# Altium footprint library North POLE.PcbLib: 419 footprints (part 9 of 27)
Each footprint in its own frame and in the unit in brackets; x right, y up, seen from the top. Pads: shape width x height; smd on the part's side, far side on the other; paste and mask are expansions set on the pad; w line width, h text height; cw(c..) or ccw(c..) is an arc to the next point about the centre after c.
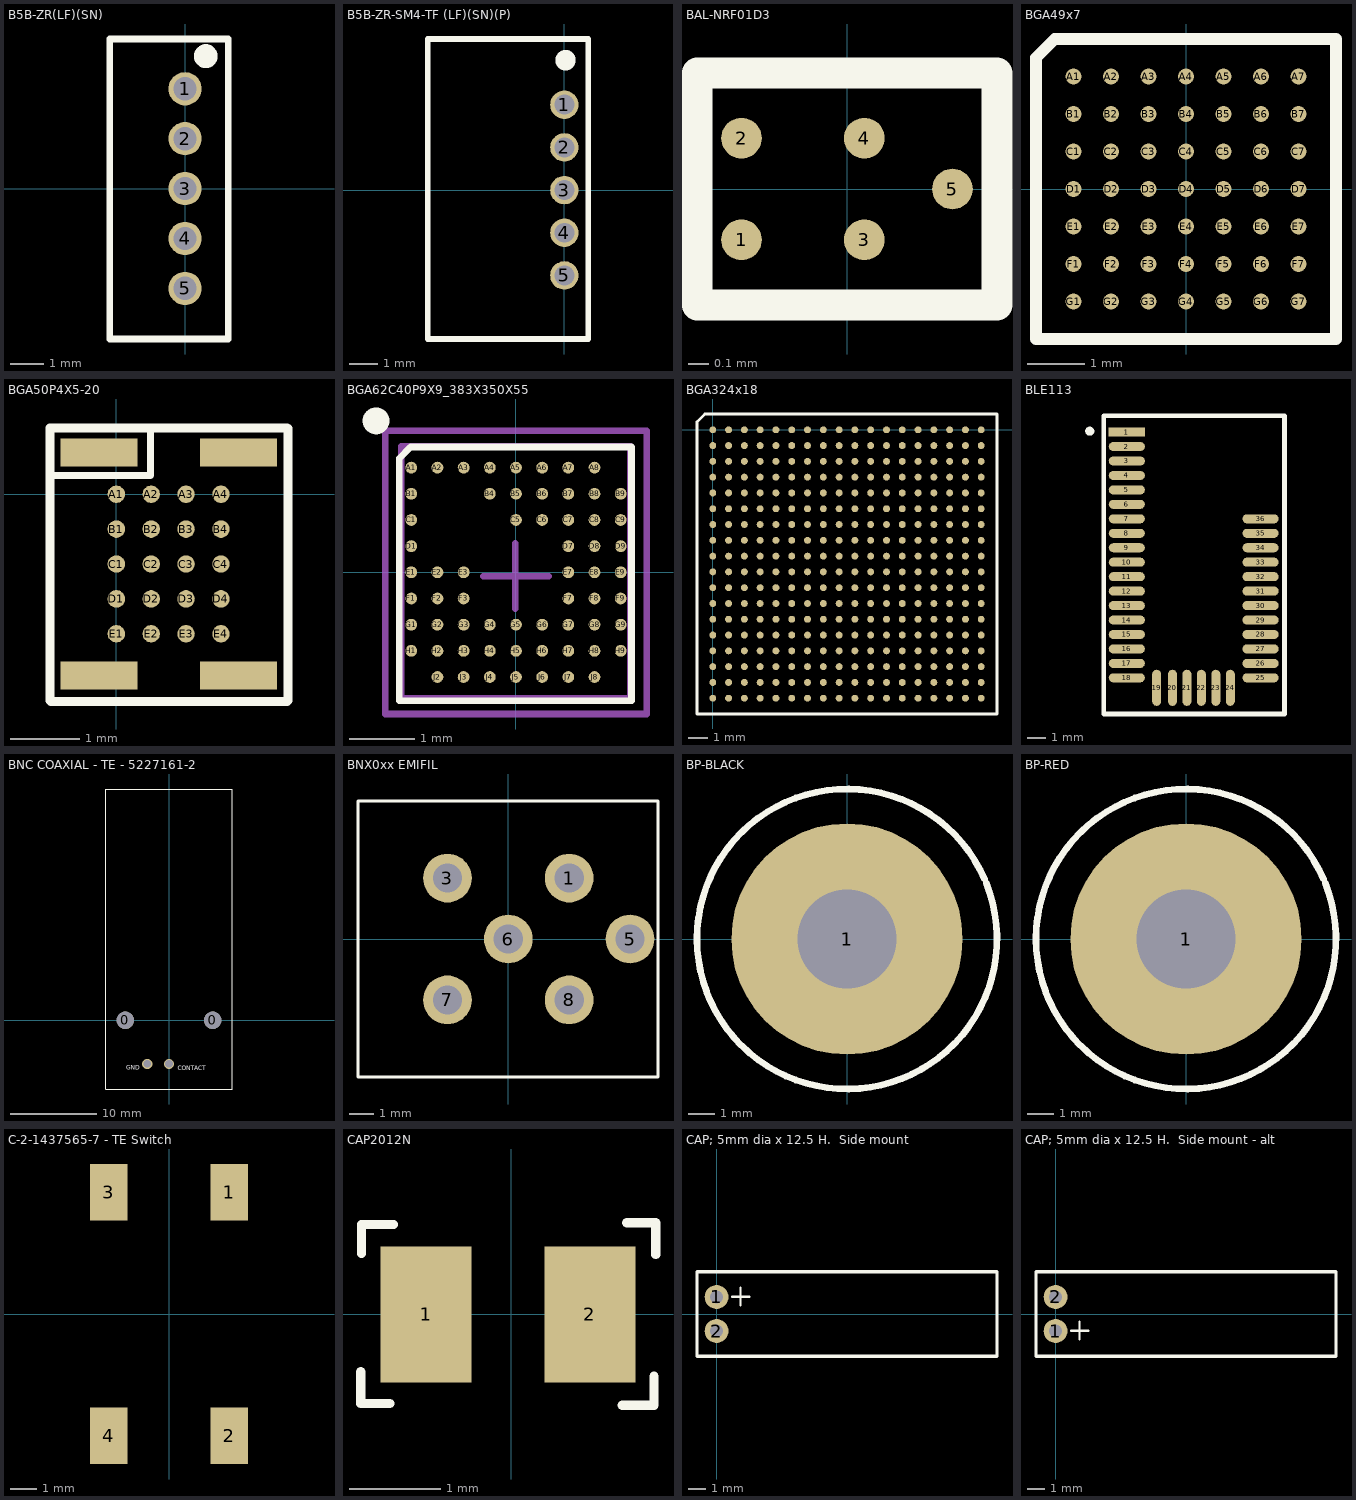
[diagram p8: the footprints below, top view; thin cyan lines are the x and y axes]

## B5B-ZR(LF)(SN) [mm] "0.156-inch-separation 1x2 header with shroud"
pads (5):
  round 1 hole 0.7: 1(0,3) 2(0,1.5) 3(0,0) 4(0,-1.5) 5(0,-3)
Top Overlay:
  lines w0.203: -2.261,-4.521 -2.261,4.496 1.295,4.496 1.295,-4.521 -2.261,-4.521
  lines w0.508: 0.68,4.069 ccw(c0.624,3.981) 0.711,4.039
3D body: height 4.5, standoff -2.7, extent -2.21,-4.5 1.29,4.5

## B5B-ZR-SM4-TF (LF)(SN)(P) [mm] "0.156-inch-separation 1x2 header with shroud"
pads (5):
  round 1 hole 0.7: 1(0,3) 2(0,1.5) 3(0,0) 4(0,-1.5) 5(0,-3)
Top Overlay:
  lines w0.203: -4.801,-5.232 0.838,-5.232 0.838,5.309 -4.801,5.309 -4.801,-5.232
  lines w0.508: 0.095,4.654 ccw(c0.04,4.565) 0.127,4.623
3D body: height 3.75, standoff -1.45, extent -4.797,-5.275 0.203,5.225

## BAL-NRF01D3 [mm] "ST BAL-NRF01D3"
pads (5):
  round 0.2 smd: 1(-0.519,-0.25) 2(-0.519,0.25) 3(0.085,-0.25) 4(0.085,0.25) 5(0.518,0)
Top Overlay:
  lines w0.152: -0.737,-0.57 0.737,-0.57 0.737,0.57 -0.737,0.57 -0.737,-0.57
3D body: height 0.63, standoff 0, extent -0.737,-0.57 0.737,0.57

## BGA49x7 [mm]
pads (49):
  round 0.275 smd mask+0.05: A1(-1.95,1.95) A2(-1.3,1.95) A3(-0.65,1.95) A4(0,1.95) A5(0.65,1.95) A6(1.3,1.95) A7(1.95,1.95) B1(-1.95,1.3) B2(-1.3,1.3) B3(-0.65,1.3) B4(0,1.3) B5(0.65,1.3) B6(1.3,1.3) B7(1.95,1.3) C1(-1.95,0.65) C2(-1.3,0.65) C3(-0.65,0.65) C4(0,0.65) C5(0.65,0.65) C6(1.3,0.65) C7(1.95,0.65) D1(-1.95,0) D2(-1.3,0) D3(-0.65,0) D4(0,0) D5(0.65,0) D6(1.3,0) D7(1.95,0) E1(-1.95,-0.65) E2(-1.3,-0.65) E3(-0.65,-0.65) E4(0,-0.65) E5(0.65,-0.65) E6(1.3,-0.65) E7(1.95,-0.65) F1(-1.95,-1.3) F2(-1.3,-1.3) F3(-0.65,-1.3) F4(0,-1.3) F5(0.65,-1.3) F6(1.3,-1.3) F7(1.95,-1.3) G1(-1.95,-1.95) G2(-1.3,-1.95) G3(-0.65,-1.95) G4(0,-1.95) G5(0.65,-1.95) G6(1.3,-1.95) G7(1.95,-1.95)
Top Overlay:
  lines w0.2: -2.6,-2.6 2.6,-2.6 2.6,2.6 -2.275,2.6 -2.6,2.275 -2.6,-2.6
3D body: height 0.65, standoff 0.2, extent -2.52,-2.5 2.5,2.5

## BGA50P4X5-20 [mm] "4x5 BGA for OVM campea"
pads (24):
  round 0.25 smd mask+0.075: A1(0,0) A2(0.5,0) A3(1,0) A4(1.5,0) B1(0,-0.5) B2(0.5,-0.5) B3(1,-0.5) B4(1.5,-0.5) C1(0,-1) C2(0.5,-1) C3(1,-1) C4(1.5,-1) D2(0.5,-1.5) D3(1,-1.5) D4(1.5,-1.5) E1(0,-2) E2(0.5,-2) E3(1,-2) E4(1.5,-2)
  oval 0.25x0.254 smd mask+0.075: D1(0,-1.5)
  rect 1.1x0.4 smd: ""(-0.25,-2.6) ""(-0.25,0.6) ""(1.75,-2.6) ""(1.75,0.6)
Top Overlay:
  lines w0.1: -0.91,0.27 0.49,0.27 0.49,0.94
  lines w0.127: -0.95,-2.96 -0.95,0.95 2.45,0.95 2.46,0.94 2.46,-2.96 2.45,-2.97 -0.94,-2.97 -0.95,-2.96

## BGA62C40P9X9_383X350X55 [mm] "BGA, 62-Leads, Body 3,8x3,5mm,  Pitch 0,40mm"
height 0.55
pads (62):
  round 0.18 smd mask+0.102: A1(-1.6,1.6)
  round 0.18 smd: A2(-1.2,1.6) A3(-0.8,1.6) A4(-0.4,1.6) A5(0,1.6) A6(0.4,1.6) A7(0.8,1.6) A8(1.2,1.6) B1(-1.6,1.2) B4(-0.4,1.2) B5(0,1.2) B6(0.4,1.2) B7(0.8,1.2) B8(1.2,1.2) B9(1.6,1.2) C1(-1.6,0.8) C5(0,0.8) C6(0.4,0.8) C7(0.8,0.8) C8(1.2,0.8) C9(1.6,0.8) D1(-1.6,0.4) D7(0.8,0.4) D8(1.2,0.4) D9(1.6,0.4) E1(-1.6,0) E2(-1.2,0) E3(-0.8,0) E7(0.8,0) E8(1.2,0) E9(1.6,0) F1(-1.6,-0.4) F2(-1.2,-0.4) F3(-0.8,-0.4) F7(0.8,-0.4) F8(1.2,-0.4) F9(1.6,-0.4) G1(-1.6,-0.8) G2(-1.2,-0.8) G3(-0.8,-0.8) G4(-0.4,-0.8) G5(0,-0.8) G6(0.4,-0.8) G7(0.8,-0.8) G8(1.2,-0.8) G9(1.6,-0.8) H1(-1.6,-1.2) H2(-1.2,-1.2) H3(-0.8,-1.2) H4(-0.4,-1.2) H5(0,-1.2) H6(0.4,-1.2) H7(0.8,-1.2) H8(1.2,-1.2) H9(1.6,-1.2) J2(-1.2,-1.6) J3(-0.8,-1.6) J4(-0.4,-1.6) J5(0,-1.6) J6(0.4,-1.6) J7(0.8,-1.6) J8(1.2,-1.6)
Top Overlay:
  circle w0.2: c-2.139,2.314 r0.105
  lines w0.1: -1.785,-1.965 -1.785,1.74 -1.61,1.915 1.765,1.915 1.765,-1.965 -1.785,-1.965
Mechanical 13:
  lines w0.1: -1.75,-1.925 1.75,-1.925 1.75,1.925 -1.75,1.925 -1.75,-1.925
Mechanical 15:
  lines w0.1: -0.5,-0.06 0.5,-0.06 ; -0.01,-0.56 -0.01,0.44 ; -2,-2.165 2,-2.165 2,2.165 -2,2.165 -2,-2.165
3D body: height 0.5, standoff 0, extent -1.785,-1.965 1.765,1.915
3D body: height 0.51, standoff 0.5, extent -1.496,1.297 -1.297,1.497

## BGA324x18 [mm]
pads (324):
  round 0.35 smd paste+0 mask+0.06: A1(0,0) A2(0.8,0) A3(1.6,0) A4(2.4,0) A5(3.2,0) A6(4,0) A7(4.8,0) A8(5.6,0) A9(6.4,0) A10(7.2,0) A11(8,0) A12(8.8,0) A13(9.6,0) A14(10.4,0) A15(11.2,0) A16(12,0) A17(12.8,0) A18(13.6,0) B1(0,-0.8) B2(0.8,-0.8) B3(1.6,-0.8) B4(2.4,-0.8) B5(3.2,-0.8) B6(4,-0.8) B7(4.8,-0.8) B8(5.6,-0.8) B9(6.4,-0.8) B10(7.2,-0.8) B11(8,-0.8) B12(8.8,-0.8) B13(9.6,-0.8) B14(10.4,-0.8) B15(11.2,-0.8) B16(12,-0.8) B17(12.8,-0.8) B18(13.6,-0.8) C1(0,-1.6) C2(0.8,-1.6) C3(1.6,-1.6) C4(2.4,-1.6) C5(3.2,-1.6) C6(4,-1.6) C7(4.8,-1.6) C8(5.6,-1.6) C9(6.4,-1.6) C10(7.2,-1.6) C11(8,-1.6) C12(8.8,-1.6) C13(9.6,-1.6) C14(10.4,-1.6) C15(11.2,-1.6) C16(12,-1.6) C17(12.8,-1.6) C18(13.6,-1.6) D1(0,-2.4) D2(0.8,-2.4) D3(1.6,-2.4) D4(2.4,-2.4) D5(3.2,-2.4) D6(4,-2.4) D7(4.8,-2.4) D8(5.6,-2.4) D9(6.4,-2.4) D10(7.2,-2.4) D11(8,-2.4) D12(8.8,-2.4) D13(9.6,-2.4) D14(10.4,-2.4) D15(11.2,-2.4) D16(12,-2.4) D17(12.8,-2.4) D18(13.6,-2.4) E1(0,-3.2) E2(0.8,-3.2) E3(1.6,-3.2) E4(2.4,-3.2) E5(3.2,-3.2) E6(4,-3.2) E7(4.8,-3.2) E8(5.6,-3.2) E9(6.4,-3.2) E10(7.2,-3.2) E11(8,-3.2) E12(8.8,-3.2) E13(9.6,-3.2) E14(10.4,-3.2) E15(11.2,-3.2) E16(12,-3.2) E17(12.8,-3.2) E18(13.6,-3.2) F1(0,-4) F2(0.8,-4) F3(1.6,-4) F4(2.4,-4) F5(3.2,-4) F6(4,-4) F7(4.8,-4) F8(5.6,-4) F9(6.4,-4) F10(7.2,-4) F11(8,-4) F12(8.8,-4) F13(9.6,-4) F14(10.4,-4) F15(11.2,-4) F16(12,-4) F17(12.8,-4) F18(13.6,-4) G1(0,-4.8) G2(0.8,-4.8) G3(1.6,-4.8) G4(2.4,-4.8) G5(3.2,-4.8) G6(4,-4.8) G7(4.8,-4.8) G8(5.6,-4.8) G9(6.4,-4.8) G10(7.2,-4.8) G11(8,-4.8) G12(8.8,-4.8) G13(9.6,-4.8) G14(10.4,-4.8) G15(11.2,-4.8) G16(12,-4.8) G17(12.8,-4.8) G18(13.6,-4.8) H1(0,-5.6) H2(0.8,-5.6) H3(1.6,-5.6) H4(2.4,-5.6) H5(3.2,-5.6) H6(4,-5.6) H7(4.8,-5.6) H8(5.6,-5.6) H9(6.4,-5.6) H10(7.2,-5.6) H11(8,-5.6) H12(8.8,-5.6) H13(9.6,-5.6) H14(10.4,-5.6) H15(11.2,-5.6) H16(12,-5.6) H17(12.8,-5.6) H18(13.6,-5.6) J1(0,-6.4) J2(0.8,-6.4) J3(1.6,-6.4) J4(2.4,-6.4) J5(3.2,-6.4) J6(4,-6.4) J7(4.8,-6.4) J8(5.6,-6.4) J9(6.4,-6.4) J10(7.2,-6.4) J11(8,-6.4) J12(8.8,-6.4) J13(9.6,-6.4) J14(10.4,-6.4) J15(11.2,-6.4) J16(12,-6.4) J17(12.8,-6.4) J18(13.6,-6.4) K1(0,-7.2) K2(0.8,-7.2) K3(1.6,-7.2) K4(2.4,-7.2) K5(3.2,-7.2) K6(4,-7.2) K7(4.8,-7.2) K8(5.6,-7.2) K9(6.4,-7.2) K10(7.2,-7.2) K11(8,-7.2) K12(8.8,-7.2) K13(9.6,-7.2) K14(10.4,-7.2) K15(11.2,-7.2) K16(12,-7.2) K17(12.8,-7.2) K18(13.6,-7.2) L1(0,-8) L2(0.8,-8) L3(1.6,-8) L4(2.4,-8) L5(3.2,-8) L6(4,-8) L7(4.8,-8) L8(5.6,-8) L9(6.4,-8) L10(7.2,-8) L11(8,-8) L12(8.8,-8) L13(9.6,-8) L14(10.4,-8) L15(11.2,-8) L16(12,-8) L17(12.8,-8) L18(13.6,-8) M1(0,-8.8) M2(0.8,-8.8) M3(1.6,-8.8) M4(2.4,-8.8) M5(3.2,-8.8) M6(4,-8.8) M7(4.8,-8.8) M8(5.6,-8.8) M9(6.4,-8.8) M10(7.2,-8.8) M11(8,-8.8) M12(8.8,-8.8) M13(9.6,-8.8) M14(10.4,-8.8) M15(11.2,-8.8) M16(12,-8.8) M17(12.8,-8.8) M18(13.6,-8.8) N1(0,-9.6) N2(0.8,-9.6) N3(1.6,-9.6) N4(2.4,-9.6) N5(3.2,-9.6) N6(4,-9.6) N7(4.8,-9.6) N8(5.6,-9.6) N9(6.4,-9.6) N10(7.2,-9.6) N11(8,-9.6) N12(8.8,-9.6) N13(9.6,-9.6) N14(10.4,-9.6) N15(11.2,-9.6) N16(12,-9.6) N17(12.8,-9.6) N18(13.6,-9.6) P1(0,-10.4) P2(0.8,-10.4) P3(1.6,-10.4) P4(2.4,-10.4) P5(3.2,-10.4) P6(4,-10.4) P7(4.8,-10.4) P8(5.6,-10.4) P9(6.4,-10.4) P10(7.2,-10.4) P11(8,-10.4) P12(8.8,-10.4) P13(9.6,-10.4) P14(10.4,-10.4) P15(11.2,-10.4) P16(12,-10.4) P17(12.8,-10.4) P18(13.6,-10.4) R1(0,-11.2) R2(0.8,-11.2) R3(1.6,-11.2) R4(2.4,-11.2) R5(3.2,-11.2) R6(4,-11.2) R7(4.8,-11.2) R8(5.6,-11.2) R9(6.4,-11.2) R10(7.2,-11.2) R11(8,-11.2) R12(8.8,-11.2) R13(9.6,-11.2) R14(10.4,-11.2) R15(11.2,-11.2) R16(12,-11.2) R17(12.8,-11.2) R18(13.6,-11.2) T1(0,-12) T2(0.8,-12) T3(1.6,-12) T4(2.4,-12) T5(3.2,-12) T6(4,-12) T7(4.8,-12) T8(5.6,-12) T9(6.4,-12) T10(7.2,-12) T11(8,-12) T12(8.8,-12) T13(9.6,-12) T14(10.4,-12) T15(11.2,-12) T16(12,-12) T17(12.8,-12) T18(13.6,-12) U1(0,-12.8) U2(0.8,-12.8) U3(1.6,-12.8) U4(2.4,-12.8) U5(3.2,-12.8) U6(4,-12.8) U7(4.8,-12.8) U8(5.6,-12.8) U9(6.4,-12.8) U10(7.2,-12.8) U11(8,-12.8) U12(8.8,-12.8) U13(9.6,-12.8) U14(10.4,-12.8) U15(11.2,-12.8) U16(12,-12.8) U17(12.8,-12.8) U18(13.6,-12.8) V1(0,-13.6) V2(0.8,-13.6) V3(1.6,-13.6) V4(2.4,-13.6) V5(3.2,-13.6) V6(4,-13.6) V7(4.8,-13.6) V8(5.6,-13.6) V9(6.4,-13.6) V10(7.2,-13.6) V11(8,-13.6) V12(8.8,-13.6) V13(9.6,-13.6) V14(10.4,-13.6) V15(11.2,-13.6) V16(12,-13.6) V17(12.8,-13.6) V18(13.6,-13.6)
Top Overlay:
  lines w0.127: -0.8,-14.4 -0.8,0.4 -0.4,0.8 14.4,0.8 14.4,-14.4 -0.8,-14.4

## BLE113 [mm] "Bluegiga BLE113 Module"
height 2
pads (36):
  rect 2x0.5 smd: 1(-1182.525,-1196)
  oval 2x0.5 smd: 2(-1182.525,-1196.8) 3(-1182.525,-1197.6) 4(-1182.525,-1198.4) 5(-1182.525,-1199.2) 6(-1182.525,-1200) 7(-1182.525,-1200.8) 8(-1182.525,-1201.6) 9(-1182.525,-1202.4) 10(-1182.525,-1203.2) 11(-1182.525,-1204) 12(-1182.525,-1204.8) 13(-1182.525,-1205.6) 14(-1182.525,-1206.4) 15(-1182.525,-1207.2) 16(-1182.525,-1208) 17(-1182.525,-1208.8) 18(-1182.525,-1209.6) 25(-1175.125,-1209.6) 26(-1175.125,-1208.8) 27(-1175.125,-1208) 28(-1175.125,-1207.2) 29(-1175.125,-1206.4) 30(-1175.125,-1205.6) 31(-1175.125,-1204.8) 32(-1175.125,-1204) 33(-1175.125,-1203.2) 34(-1175.125,-1202.4) 35(-1175.125,-1201.6) 36(-1175.125,-1200.8)
  oval 0.5x2 smd: 19(-1180.875,-1210.15) 20(-1180,-1210.15) 21(-1179.2,-1210.15) 22(-1178.4,-1210.15) 23(-1177.6,-1210.15) 24(-1176.8,-1210.15)
Top Overlay:
  circle w0.254: c-1184.575,-1195.95 r0.125
  lines w0.254: -1183.8,-1211.6 -1173.8,-1211.6 -1173.8,-1195.1 -1183.8,-1195.1 -1183.8,-1211.6
3D body: height 1.3, standoff 0.6, extent -1183.2,-1211 -1174.4,-1200.625
3D body: height 0.6, standoff 0, extent -1183.8,-1211.6 -1173.8,-1195.1
3D body: height 1.3, standoff 0.6, extent -1177.576,-1196.924 -1174.401,-1195.4

## BNC COAXIAL - TE - 5227161-2 [mm]
pads (2):
  round 2.01 hole 2.01 unplated: 0(-5.08,0) 0(5.08,0)
via 0,-5.08 diameter 1.2 hole 0.89
via -2.54,-5.08 diameter 1.2 hole 0.89
Top Overlay:
  lines w0.127: -7.38,-8 -7.38,26.93 7.38,26.93 7.38,-8 -7.38,-8
  text "CONTACT" at 1.016,-5.791 h0.5
  text "GND" at -5.004,-5.74 h0.5

## BNX0xx EMIFIL [mm]
pads (6):
  round 2 hole 1.2 mask+0.04: 1(2.5,2.5) 3(-2.5,2.5) 5(5,0) 6(0,0) 7(-2.5,-2.5) 8(2.5,-2.5)
Top Overlay:
  lines w0.127: -6.172,-5.664 6.147,-5.664 6.147,5.664 -6.172,5.664 -6.172,-5.664
3D body: height 12.5, standoff -5, extent -6,-5.5 6,5.5

## BP-BLACK [mm]
pads (1):
  round 8.89 hole 3.81 mask+0.04: 1(0,0)
Top Overlay:
  lines w0.254: 5.286,2.293 ccw(c0,0) 5.345,2.153
3D body: height 26.7, standoff -11.3, extent -5.965,-5.965 5.965,5.965

## BP-RED [mm]
pads (1):
  round 8.89 hole 3.81 mask+0.04: 1(0,0)
Top Overlay:
  lines w0.254: 5.286,2.293 ccw(c0,0) 5.345,2.153
3D body: height 26.7, standoff -11.3, extent -5.965,-5.965 5.965,5.965

## C-2-1437565-7 - TE Switch [mm]
pads (4):
  rect 1.4x2.1 smd mask+0.08: 1(2.25,4.55) 2(2.25,-4.55) 3(-2.25,4.55) 4(-2.25,-4.55)
3D body: height 4.36, standoff -0.03, extent -2.873,-5.152 3.127,4.848

## CAP2012N [mm] "0805-size capacitor"
pads (2):
  rect 1x1.5 smd mask+0.08: 1(-0.94,0) 2(0.864,0)
Top Overlay:
  lines w0.102: -1.66,-0.63 -1.66,-0.98 -1.34,-0.98 ; -1.65,0.67 -1.65,0.99 -1.3,0.99 ; 1.22,-1 1.57,-1 1.57,-0.68 ; 1.27,1.01 1.59,1.01 1.59,0.66
3D body: height 0.93, standoff -0.01, extent -1.562,-0.708 1.438,0.692

## CAP; 5mm dia x 12.5 H.  Side mount [mil]
pads (2):
  round 55 hole 30 unplated mask+3.15: 1(0,39.37) 2(0,-39.37)
Top Overlay:
  lines w5: 36.33,40 75.67,40 ; 55.59,19.65 55.59,60.63
  lines w8: -45.23,-97.77 -45.23,98.23 649.12,98.23 649.12,-98.23 -44.77,-98.23
3D body: height 196.07, standoff 0, extent 157,-98.23 649.12,98.23

## CAP; 5mm dia x 12.5 H.  Side mount - alt [mil]
pads (2):
  round 55 hole 30 unplated mask+3.15: 1(0,-39.37) 2(0,39.37)
Top Overlay:
  lines w5: 36.33,-38.74 75.67,-38.74 ; 55.59,-59.09 55.59,-18.11
  lines w8: -45.23,-97.77 -45.23,98.23 649.12,98.23 649.12,-98.23 -44.77,-98.23
3D body: height 196.07, standoff 0, extent 157,-98.23 649.12,98.23